# Altium footprint library AMAP4BPXEVBv2.PcbLib: 58 footprints (part 4 of 4)
Each footprint in its own frame and in the unit in brackets; x right, y up, seen from the top. Pads: shape width x height; smd on the part's side, far side on the other; paste and mask are expansions set on the pad; w line width, h text height; cw(c..) or ccw(c..) is an arc to the next point about the centre after c.
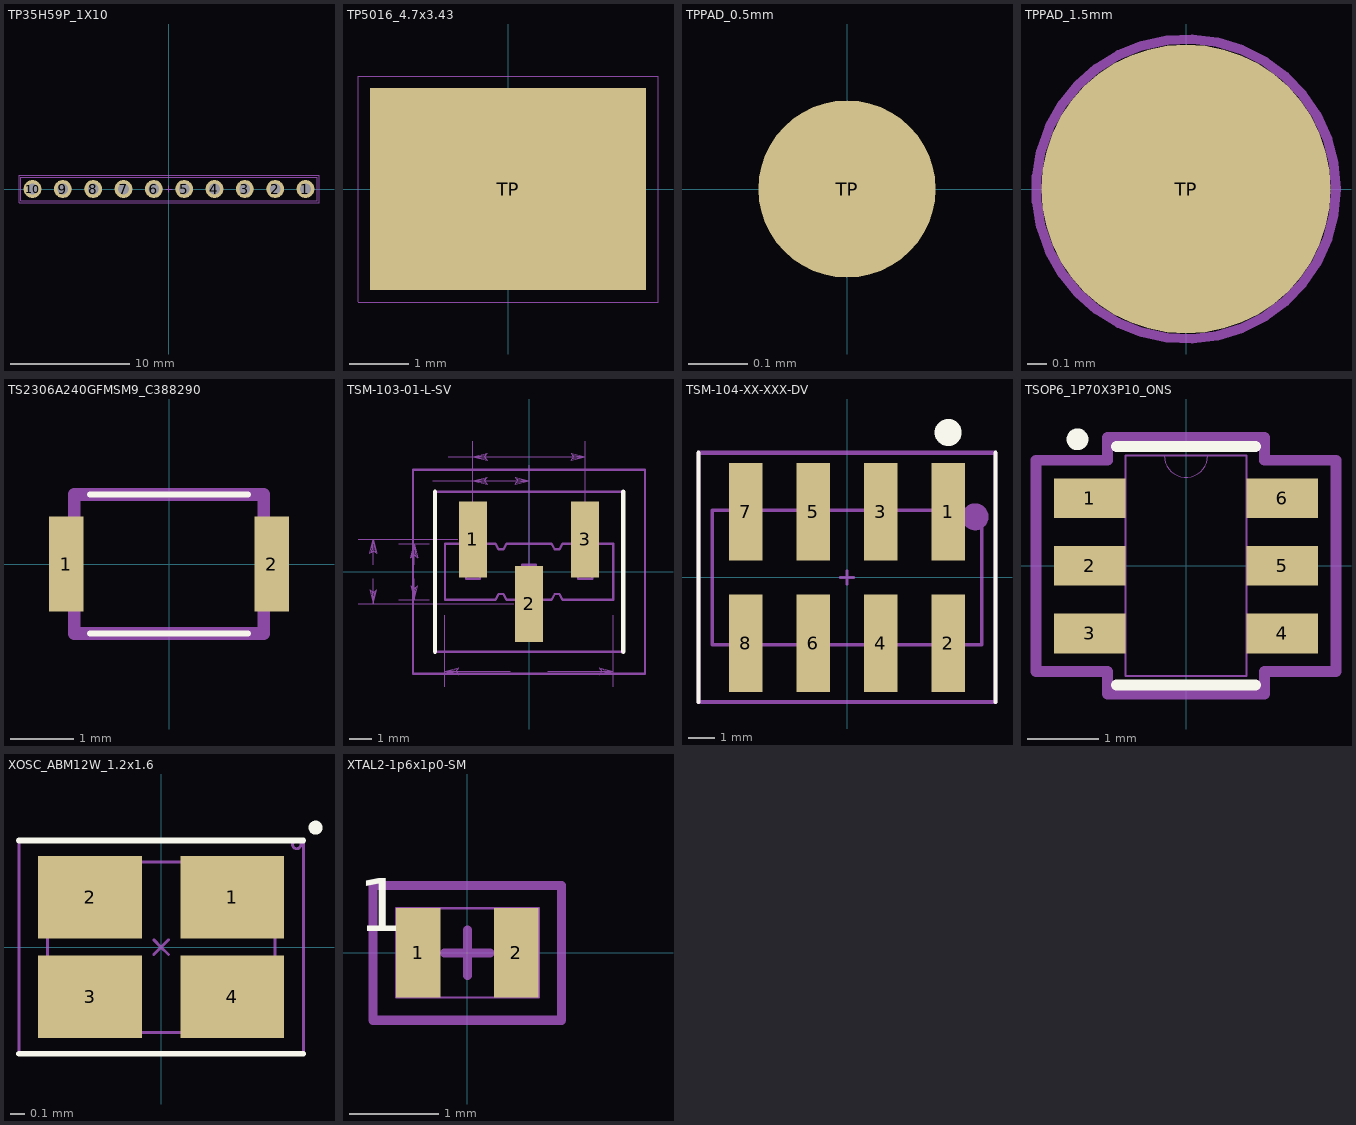
[diagram p3: the footprints below, top view; thin cyan lines are the x and y axes]

## TP35H59P_1X10 [mil] "TP35H59P_1X10"
pads (10):
  round 59 hole 35: 1(450,0) 2(350,0) 3(250,0) 4(150,0) 5(50,0) 6(-50,0) 7(-150,0) 8(-250,0) 9(-350,0) 10(-450,0)
Top Assembly:
  lines w4: -494.51,-44.51 494.51,-44.51 494.51,44.51 -494.51,44.51 -494.51,-44.51
  text ".Designator" at -90.13,7.51 h40
  text "1" at 514.06,-12.85 h40
  text "10" at -543.43,-12.63 h40
Top Courtyard:
  lines w1: -489.5,-39.5 489.5,-39.5 489.5,39.5 -489.5,39.5 -489.5,-39.5
Top Component Center:
  lines w4: -10,0 10,0 ; 0,-10 0,10

## TP5016_4.7x3.43 [mm] "SMD Test point loop"
height 2.29
pads (1):
  rect 4.7x3.43 smd mask+0.05: TP(0,0)
Top Overlay:
  text ".Designator" at -2.608,-1.753 h0.5
Top Assembly:
  lines w0.02: -1.905,-1.42 1.905,-1.42 1.905,1.42 -1.905,1.42 -1.905,-1.42
  text ".Designator" at 0.19,-0.813 h1.02
Top Courtyard:
  lines w0.02: -2.55,-1.925 2.55,-1.925 ; -2.55,-1.915 -2.55,1.915 2.55,1.915 2.55,-1.915
Top Component Center:
  lines w0.02: -0.052,-0.052 0,0 ; -0.052,0.052 0,0 ; 0.052,-0.052 0,0 ; 0.052,0.052 0,0
3D body "keystone-PN5016.STEP": height 2.5, standoff 0.21, extent -1.912,-1.434 1.898,1.422

## TPPAD_0.5mm [mm] "A 1.5mm Copper Pad Testpoint"
pads (1):
  round 0.3 smd paste-0.75: TP(0,0)
Top Assembly:
  text ".Designator" at -0.406,-0.033 h0.5
  text "Test point. DNP." at -0.838,-0.464 h0.25

## TPPAD_1.5mm [mm] "A 1.5mm Copper Pad Testpoint"
pads (1):
  round 1.5 smd paste-0.75: TP(0,0)
Top Assembly:
  text "Test point. DNP." at -0.838,-0.464 h0.25
  text ".Designator" at -0.406,-0.033 h0.5
Top Courtyard:
  circle w0.05: c0,0 r0.778

## TS2306A240GFMSM9_C388290 [mm]
pads (2):
  rect 0.55x1.5 smd: 1(-1.625,0) 2(1.625,0)
Top Overlay:
  lines w0.1: -1.25,-1.1 1.25,-1.1 -1.25,-1.1 ; -1.25,1.1 1.25,1.1 -1.25,1.1
Top 3D Body:
  lines w0.2: -1.5,-1.1 1.5,-1.1 1.5,1.1 -1.5,1.1 -1.5,-1.1
3D body "TS2306A-240GF-MSM-9_C388290.stp": height 1.1, standoff 0, extent -1.845,-1.1 1.845,1.1

## TSM-103-01-L-SV [mm]
pads (3):
  rect 1.27x3.43 smd: 1(-2.54,1.46) 2(0,-1.46) 3(2.54,1.46)
Top Overlay:
  lines w0.2: -4.26,-3.627 -4.26,3.626 ; 4.26,-3.627 4.26,3.626
Top Paste:
  region: 3.175,-0.255 1.905,-0.255 1.905,3.175 3.175,3.175
  region: 0.635,-3.175 -0.635,-3.175 -0.635,0.255 0.635,0.255
  region: -1.905,-0.255 -3.175,-0.255 -3.175,3.175 -1.905,3.175
Top Solder:
  region: 3.226,-0.306 1.854,-0.306 1.854,3.226 3.226,3.226
  region: 0.686,-3.226 -0.686,-3.226 -0.686,0.306 0.686,0.306
  region: -1.854,-0.306 -3.226,-0.306 -3.226,3.226 -1.854,3.226
Top Assembly:
  lines w0.1: -2.856,1.27 -2.856,2.642 -2.221,2.642 -2.221,1.27 ; -0.319,-1.27 -0.319,-2.642 0.316,-2.642 0.316,-1.27 ; 1.27,-1.016 1.376,-1.016 1.523,-1.27 3.81,-1.27 3.81,-1.016 3.81,1.016 3.81,1.27 1.523,1.27 1.376,1.016 1.27,1.016 ; 1.271,-1.016 1.164,-1.016 1.017,-1.27 -1.017,-1.27 -1.164,-1.016 -1.27,-1.016 -1.376,-1.016 -1.523,-1.27 -3.81,-1.27 -3.81,-1.016 -3.81,1.016 -3.81,1.27 -1.523,1.27 -1.376,1.016 -1.27,1.016 -1.164,1.016 -1.017,1.27 1.017,1.27 1.164,1.016 1.271,1.016 ; 2.224,1.27 2.224,2.642 2.859,2.642 2.859,1.27 ; -4.26,-3.627 4.26,-3.627 4.26,3.626 -4.26,3.626 -4.26,-3.627 ; -2.856,-0.318 -2.856,0.318 -2.221,0.318 -2.221,-0.318 -2.856,-0.318 ; -0.319,-0.318 0.316,-0.318 0.316,0.318 -0.319,0.318 -0.319,-0.318 ; 2.224,-0.318 2.224,0.318 2.859,0.318 2.859,-0.318 2.224,-0.318
  text "1" at -3.2,2.54 h1.27
  text "3" at 3.912,2.489 h1.27
  text ".Designator" at -3.391,-3.226 h1.02
Mechanical 3:
  lines w0: -7.75,-1.46 -0.701,-1.46 ; -7.75,1.46 -3.241,1.46 ; -7.048,-0.318 -7.048,-1.46 ; -7.048,0.318 -7.048,1.46 ; -5.908,-1.27 -4.511,-1.27 ; -5.908,1.27 -4.511,1.27 ; -5.207,-0.318 -5.207,-1.27 ; -5.207,0.318 -5.207,1.27 ; -4.356,4.128 -2.54,4.128 ; -3.81,-5.21 -3.81,-1.971 ; -3.658,5.207 -2.54,5.207 ; -2.54,4.829 -2.54,2.162 -2.54,5.908 ; -0.851,-4.508 -3.81,-4.508 ; 0,-0.759 0,4.829 ; 0.851,-4.508 3.81,-4.508 ; 2.54,2.162 2.54,5.908 ; 3.81,-5.21 3.81,-1.971 ; -7.207,-0.826 -7.048,-1.46 ; -7.207,-0.826 -7.048,-0.952 ; -7.207,-0.826 -7.128,-0.889 -7.048,-1.46 ; -7.048,-1.46 -6.89,-0.826 -7.048,-0.952 ; -7.048,-1.46 -6.969,-0.889 -7.048,-0.952 ; -7.048,-1.46 -7.048,-0.952 ; -7.048,0.952 -7.207,0.826 -7.048,1.46 ; -7.048,0.952 -6.89,0.826 ; -7.048,0.952 -7.128,0.889 -7.048,1.46 ; -7.048,0.952 -7.048,1.46 ; -7.048,1.46 -6.89,0.826 ; -7.048,1.46 -6.969,0.889 -6.89,0.826 ; -5.366,-0.635 -5.207,-1.27 ; -5.366,-0.635 -5.207,-0.762 ; -5.366,-0.635 -5.286,-0.698 -5.207,-1.27 ; -5.207,-1.27 -5.048,-0.635 -5.207,-0.762 ; -5.207,-1.27 -5.128,-0.698 -5.207,-0.762 ; -5.207,-1.27 -5.207,-0.762 ; -5.207,0.762 -5.366,0.635 -5.207,1.27 ; -5.207,0.762 -5.048,0.635 ; -5.207,0.762 -5.286,0.698 -5.207,1.27 ; -5.207,0.762 -5.207,1.27 ; -5.207,1.27 -5.048,0.635 ; -5.207,1.27 -5.128,0.698 -5.048,0.635 ; -3.81,-4.508 -3.175,-4.35 ; -3.81,-4.508 -3.175,-4.667 -3.302,-4.508 ; -3.81,-4.508 -3.238,-4.588 -3.302,-4.508 ; -3.81,-4.508 -3.302,-4.508 ; -3.81,-4.508 -3.238,-4.429 -3.175,-4.35 ; -3.302,-4.508 -3.175,-4.35 ; -2.54,4.128 -1.905,4.286 ; -2.54,4.128 -1.905,3.969 -2.032,4.128 ; -2.54,4.128 -1.968,4.048 -2.032,4.128 ; -2.54,4.128 -2.032,4.128 ; -2.54,4.128 -1.968,4.207 -1.905,4.286 ; -2.54,4.128 0,4.128 ; -2.54,5.207 -1.905,5.366 ; -2.54,5.207 -1.905,5.048 -2.032,5.207 ; -2.54,5.207 -1.968,5.128 -2.032,5.207 ; -2.54,5.207 -2.032,5.207 ; -2.54,5.207 -1.968,5.286 -1.905,5.366 ; -2.54,5.207 2.54,5.207 ; -2.032,4.128 -1.905,4.286 ; -2.032,5.207 -1.905,5.366 ; -0.635,3.969 0,4.128 ; -0.635,3.969 -0.508,4.128 ; -0.635,3.969 -0.572,4.048 0,4.128 ; -0.508,4.128 -0.635,4.286 0,4.128 ; -0.508,4.128 -0.572,4.207 0,4.128 ; -0.508,4.128 0,4.128 ; 1.905,5.048 2.54,5.207 ; 1.905,5.048 2.032,5.207 ; 1.905,5.048 1.968,5.128 2.54,5.207 ; 2.032,5.207 1.905,5.366 2.54,5.207 ; 2.032,5.207 1.968,5.286 2.54,5.207 ; 2.032,5.207 2.54,5.207 ; 3.175,-4.667 3.81,-4.508 ; 3.175,-4.667 3.302,-4.508 ; 3.175,-4.667 3.238,-4.588 3.81,-4.508 ; 3.302,-4.508 3.175,-4.35 3.81,-4.508 ; 3.302,-4.508 3.238,-4.429 3.81,-4.508 ; 3.302,-4.508 3.81,-4.508
  text "2.921" at -7.709,-0.127 h0.25
  text "2.540" at -5.867,-0.127 h0.25
  text "2.540" at -5.867,4 h0.25
  text "5.080" at -5.169,5.08 h0.25
  text "7.620" at -0.66,-4.636 h0.25
Top Courtyard:
  lines w0.102: -5.257,-4.624 5.257,-4.624 5.257,4.623 -5.257,4.623 -5.257,-4.624
Top Component Center:
  lines w0.051: -0.254,0 0.254,0 ; 0,-0.254 0,0.254
3D body "TSM-103-01-L-SV.stp": height 9.65, standoff 0, extent -3.81,-2.642 3.81,2.642

## TSM-104-XX-XXX-DV [mil] "TSM-104-XX-XXX-DV"
pads (8):
  rect 50x145 smd: 1(150,97.5) 2(150,-97.5) 3(50,97.5) 4(50,-97.5) 5(-50,97.5) 6(-50,-97.5) 7(-150,97.5) 8(-150,-97.5)
Top Overlay:
  circle w20: c150,215 r10
  lines w6: -220,-185 -220,185 ; 220,-185 220,185
  text ".Designator" at -268.34,25.97 h80
Top Assembly:
  circle w20: c190,90 r10
  lines w5: -200,-100 200,-100 200,100 -200,100 -200,-100
  text ".Designator" at 98.13,2.49 h40
Top Courtyard:
  lines w5.98: -220,-185 220,-185 ; -220,185 220,185
  lines w6: -220,-185 -220,185 ; 220,-185 220,185
Top Component Center:
  lines w4: -10,0 10,0 ; 0,-10 0,10
3D body "TSM-104-01-X-DV.step": height 380, standoff 0, extent -200,-145 200,145

## TSOP6_1P70X3P10_ONS [mil]
pads (6):
  rect 39.5x22 smd paste+0 mask+0: 1(-53.25,37.4) 2(-53.25,0) 3(-53.25,-37.4) 4(53.25,-37.4) 5(53.25,0) 6(53.25,37.4)
Top Overlay:
  circle w8: c-60,70 r2
  lines w6: -38.5,-66 38.5,-66 ; -38.5,66 38.5,66
  text ".Designator" at 84,48.51 h40
Top Assembly:
  lines w0: -12,61 ccw(c0,61) 12,61
  lines w1: -59,-47.4 -33.5,-47.4 -33.5,-27.4 -59,-27.4 -59,-47.4 ; -59,-10 -33.5,-10 -33.5,10 -59,10 -59,-10 ; -59,27.4 -33.5,27.4 -33.5,47.4 -59,47.4 -59,27.4 ; -33.5,-61 33.5,-61 33.5,61 -33.5,61 -33.5,-61 ; 33.5,-47.4 59,-47.4 59,-27.4 33.5,-27.4 33.5,-47.4 ; 33.5,-10 59,-10 59,10 33.5,10 33.5,-10 ; 33.5,27.4 59,27.4 59,47.4 33.5,47.4 33.5,27.4
  text ".Designator" at -43.07,-10.52 h20
Top Courtyard:
  lines w6: -83,-58.4 -83,58.4 -43.5,58.4 -43.5,71 43.5,71 43.5,58.4 83,58.4 83,-58.4 43.5,-58.4 43.5,-71 -43.5,-71 -43.5,-58.4 -83,-58.4
3D body: height 10, standoff 0, extent -33.55,-60.91 33.53,61.03

## XOSC_ABM12W_1.2x1.6 [mm] "Footprint for the ABM12W series of Xtal oscilators"
height 0.4
pads (4):
  rect 0.73x0.58 smd mask+0.03: 1(0.5,0.35) 2(-0.5,0.35) 3(-0.5,-0.35) 4(0.5,-0.35)
Top Overlay:
  circle w0.05: c1.086,0.841 r0.024
  lines w0.04: -1,-0.75 1,-0.75 ; -1,0.75 1,0.75
  text ".Designator" at -1.813,1.588 h1.02
Top Assembly:
  circle w0.02: c0.953,0.722 r0.029
  lines w0.02: -0.8,-0.6 -0.8,0.6 0.8,0.6 0.8,-0.6 -0.8,-0.6
  text ".Designator" at -0.279,-0.059 h0.5
Top Courtyard:
  lines w0.02: -1,-0.75 -1,0.75 1,0.75 1,-0.75 -1,-0.75
Top Component Center:
  lines w0.02: -0.052,-0.052 0,0 ; -0.052,0.052 0,0 ; 0.052,-0.052 0,0 ; 0.052,0.052 0,0
3D body "ABM12W.STEP": height 0.4, standoff 0, extent -0.8,-0.6 0.8,0.6

## XTAL2-1p6x1p0-SM [mm] "XTAL2-1P6X1P0-SM"
pads (2):
  rect 0.5x1.001 smd: 1(-0.549,0) 2(0.549,0)
Top Overlay:
  text ".Designator" at 1.651,-0.787 h1.02
  text "1" at -1.224,0.049 h1.02
Top Assembly:
  lines w0.025: -0.8,-0.5 0.8,-0.5 0.8,0.5 -0.8,0.5 -0.8,-0.5
  text "2" at 0.884,-0.481 h1.02
  text "1" at -1.158,-0.49 h1.02
  text ".Designator" at 0.158,-2.28 h1.02
Top Courtyard:
  lines w0.102: -1.054,-0.754 -1.054,0.754 1.054,0.754 1.054,-0.754 -1.054,-0.754
Top Component Center:
  lines w0.102: -0.254,0 0.254,0 ; 0,-0.254 0,0.254
3D body: height 0.4, standoff 0, extent -0.8,-0.5 0.8,0.5